# Altium footprint library DCDCv1.1.PcbLib: 115 footprints (part 8 of 8)
Each footprint in its own frame and in the unit in brackets; x right, y up, seen from the top. Pads: shape width x height; smd on the part's side, far side on the other; paste and mask are expansions set on the pad; w line width, h text height; cw(c..) or ccw(c..) is an arc to the next point about the centre after c.
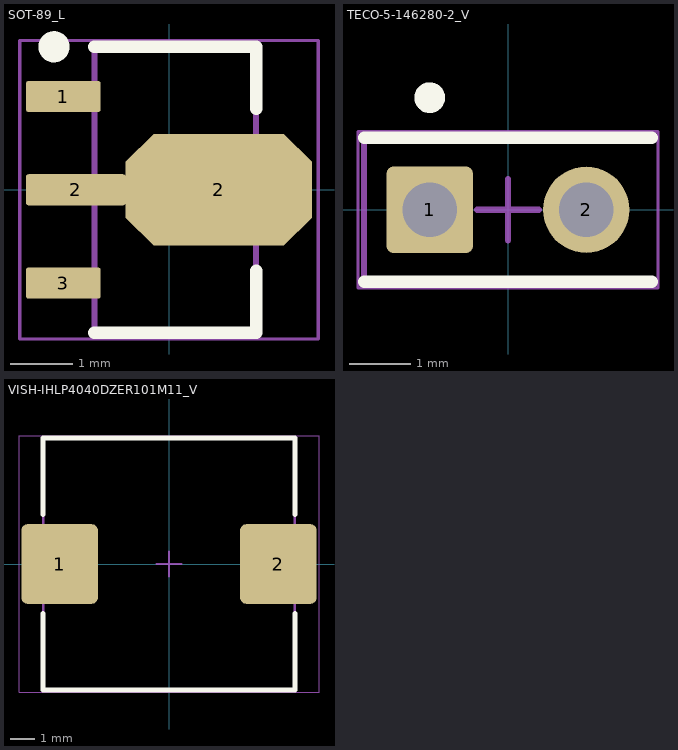
[diagram p7: the footprints below, top view; thin cyan lines are the x and y axes]

## SOT-89_L [mm]
pads (4):
  rrect15% 1.2x0.5 smd: 1(-1.7,1.5) 3(-1.7,-1.5)
  rrect15% 1.6x0.5 smd: 2(-1.5,0)
  oct 3x1.8 smd: 2(0.8,0)
Top Overlay:
  circle w0.25: c-1.85,2.3 r0.125
  lines w0.2: -1.2,-2.3 1.4,-2.3 1.4,-1.3 ; -1.2,2.3 1.4,2.3 1.4,1.3
Mechanical 13:
  lines w0.1: -1.2,-2.3 -1.2,2.3 1.4,2.3 1.4,-2.3 -1.2,-2.3
Mechanical 15:
  lines w0.05: -2.4,-2.4 -2.4,2.4 2.4,2.4 2.4,-2.4 -2.4,-2.4
  lines w0.1: -0.4,0 0.6,0 ; 0.1,-0.5 0.1,0.5
3D body: height 1.6, standoff 0, extent -1.2,-2.3 1.4,2.3

## TECO-5-146280-2_V [mm]
pads (2):
  rrect15% 1.4x1.4 hole 0.89: 1(-1.27,0)
  round 1.4 hole 0.89: 2(1.27,0)
Top Overlay:
  circle w0.25: c-1.27,1.82 r0.125
  lines w0.2: -2.335,-1.17 2.335,-1.17 ; -2.335,1.17 2.335,1.17
Mechanical 13:
  lines w0.1: 2.335,-1.17 -2.335,-1.17 -2.335,1.17 2.335,1.17
Mechanical 15:
  lines w0.05: -2.435,-1.27 2.435,-1.27 2.435,1.27 -2.435,1.27 -2.435,-1.27
  lines w0.1: -0.5,0 0.5,0 ; 0,-0.5 0,0.5
3D body "c-5-146280-2-d-3d.stp": height 5.33, standoff -5.84, extent -2.337,-1.168 2.337,1.169

## VISH-IHLP4040DZER101M11_V [mm]
pads (2):
  rrect15% 3.124x3.251 smd: 1(-4.47,0) 2(4.471,0)
Top Overlay:
  lines w0.2: -5.15,-2.026 -5.15,-5.15 5.15,-5.15 5.15,-2.026 ; -5.15,2.026 -5.15,5.15 5.15,5.15 5.15,2.026
Mechanical 13:
  lines w0.1: -5.15,-5.15 -5.15,5.15 5.15,5.15 5.15,-5.15 -5.15,-5.15
Mechanical 15:
  lines w0.05: -6.132,-5.25 -6.132,5.25 6.132,5.25 6.132,-5.25 -6.132,-5.25
  lines w0.1: -0.5,0 0.5,0 ; 0,-0.5 0,0.5
3D body "INDM103103X40L.step": height 4, standoff 0, extent -5.37,-5.15 5.37,5.15